# Altium footprint library ACTION标准库.pcblib: 504 footprints (part 27 of 32)
Each footprint in its own frame and in the unit in brackets; x right, y up, seen from the top. Pads: shape width x height; smd on the part's side, far side on the other; paste and mask are expansions set on the pad; w line width, h text height; cw(c..) or ccw(c..) is an arc to the next point about the centre after c.
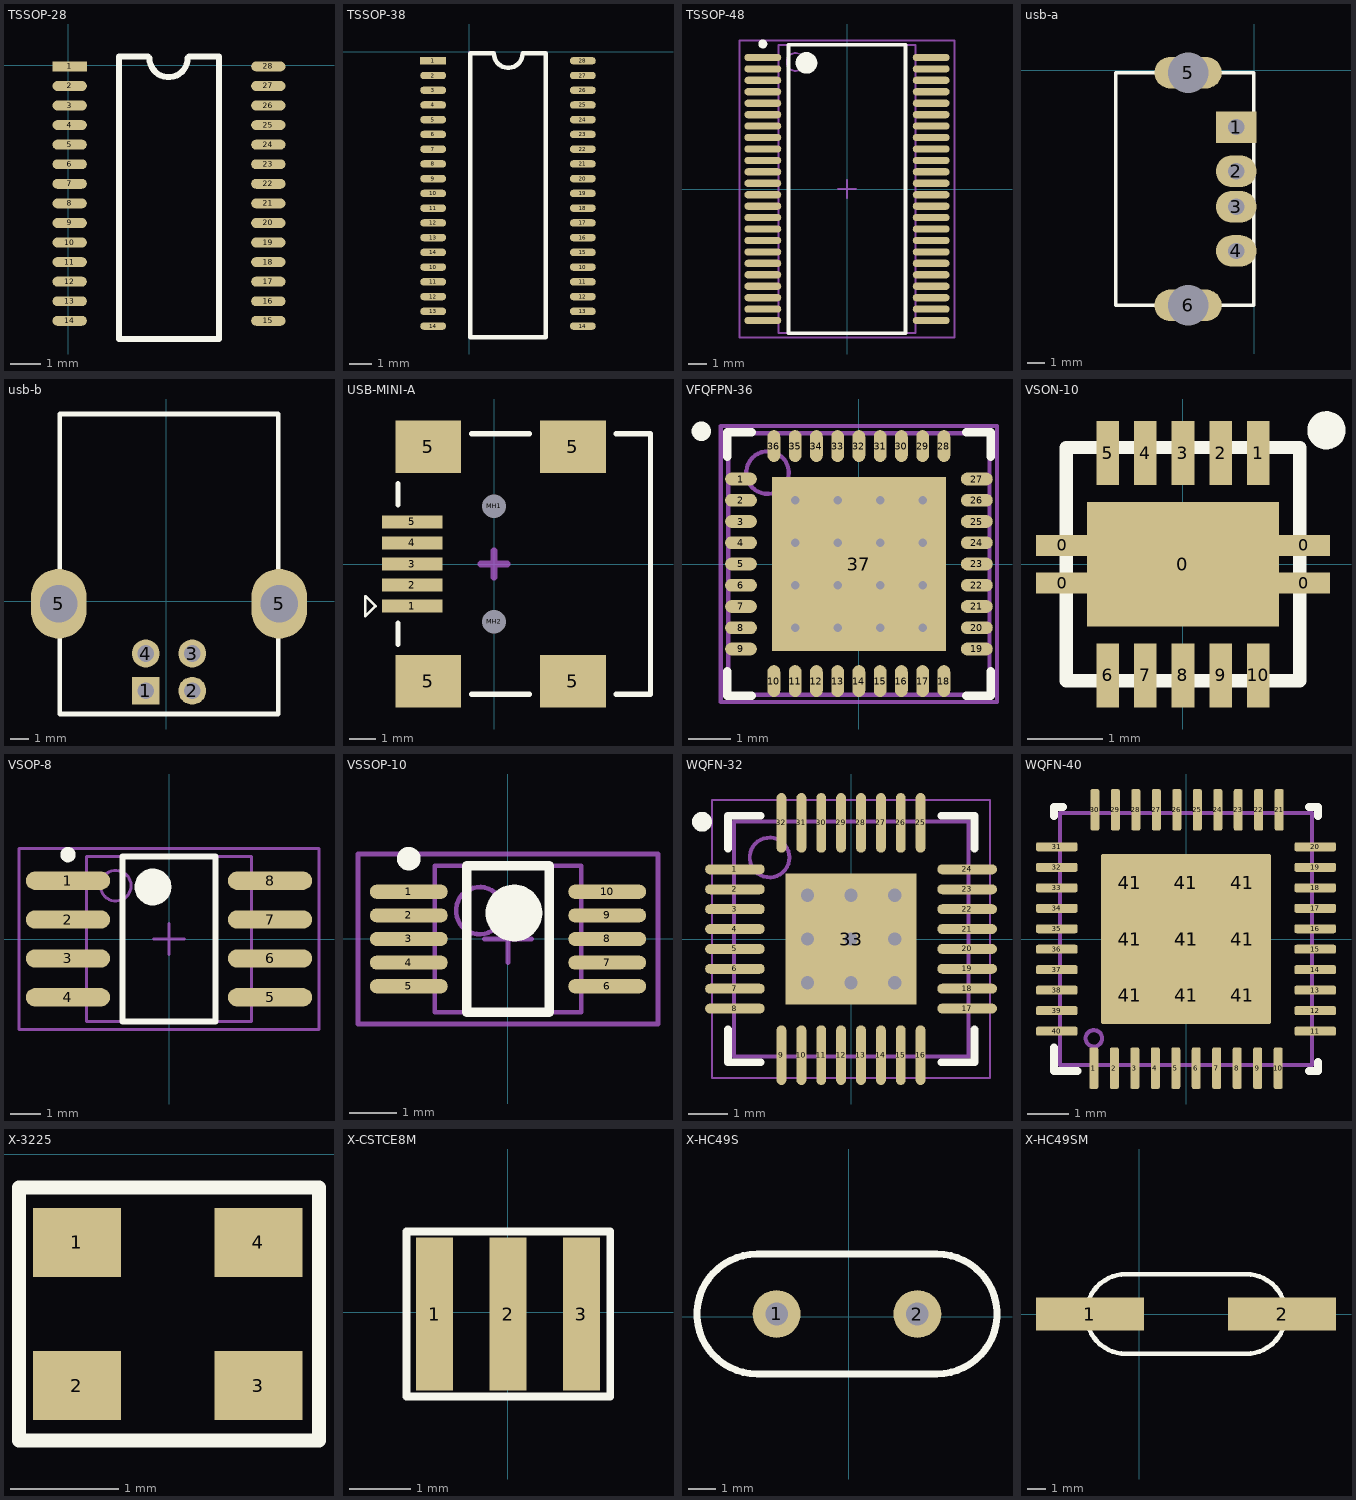
[diagram p26: the footprints below, top view; thin cyan lines are the x and y axes]

## TSSOP-28 [mm]
pads (28):
  rect 1.143x0.33 smd: 1(0.041,-0.046)
  oval 1.143x0.33 smd: 2(0.041,-0.696) 3(0.041,-1.346) 4(0.041,-1.996) 5(0.041,-2.646) 6(0.041,-3.296) 7(0.041,-3.946) 8(0.041,-4.596) 9(0.041,-5.246) 10(0.041,-5.896) 11(0.041,-6.546) 12(0.041,-7.196) 13(0.041,-7.846) 14(0.041,-8.496) 15(6.641,-8.496) 16(6.641,-7.846) 17(6.641,-7.196) 18(6.641,-6.546) 19(6.641,-5.896) 20(6.641,-5.246) 21(6.641,-4.596) 22(6.641,-3.946) 23(6.641,-3.296) 24(6.641,-2.646) 25(6.641,-1.996) 26(6.641,-1.346) 27(6.641,-0.696) 28(6.641,-0.046)
Top Overlay:
  lines w0.2: 2.642,0.279 1.676,0.279 1.676,-9.1 5.006,-9.1 5.006,0.279 4.013,0.279 ; 2.692,0.229 ccw(c3.327,0.229) 3.962,0.229
3D body "TSSOP-28.STEP": height 0.95, standoff -0.03, extent 0.178,-9.117 6.578,0.583

## TSSOP-38 [mm]
pads (38):
  rect 1.143x0.33 smd: 1(-1.584,-0.401)
  oval 1.143x0.33 smd: 2(-1.584,-1.051) 3(-1.584,-1.701) 4(-1.584,-2.351) 5(-1.584,-3.001) 6(-1.584,-3.651) 7(-1.584,-4.301) 8(-1.584,-4.951) 9(-1.584,-5.601) 10(-1.584,-9.501) 10(-1.584,-6.251) 10(5.016,-9.501) 11(-1.584,-10.151) 11(-1.584,-6.901) 11(5.016,-10.151) 12(-1.584,-10.801) 12(-1.584,-7.551) 12(5.016,-10.801) 13(-1.584,-11.451) 13(-1.584,-8.201) 13(5.016,-11.451) 14(-1.584,-12.101) 14(-1.584,-8.851) 14(5.016,-12.101) 15(5.016,-8.851) 16(5.016,-8.201) 17(5.016,-7.551) 18(5.016,-6.901) 19(5.016,-6.251) 20(5.016,-5.601) 21(5.016,-4.951) 22(5.016,-4.301) 23(5.016,-3.651) 24(5.016,-3.001) 25(5.016,-2.351) 26(5.016,-1.701) 27(5.016,-1.051) 28(5.016,-0.401)
Top Overlay:
  lines w0.2: 0.051,-12.6 3.381,-12.6 3.381,-0.076 2.362,-0.076 cw(c1.727,-0.076) 1.092,-0.076 0.051,-0.076 0.051,-12.6

## TSSOP-48 [mm]
height 2.79
pads (48):
  oval 2.05x0.4 smd: 1(-4.675,7.302) 2(-4.675,6.667) 3(-4.675,6.032) 4(-4.675,5.397) 5(-4.675,4.763) 6(-4.675,4.127) 7(-4.675,3.492) 8(-4.675,2.857) 9(-4.675,2.222) 10(-4.675,1.587) 11(-4.675,0.953) 12(-4.675,0.318) 13(-4.675,-0.318) 14(-4.675,-0.953) 15(-4.675,-1.587) 16(-4.675,-2.222) 17(-4.675,-2.857) 18(-4.675,-3.492) 19(-4.675,-4.127) 20(-4.675,-4.763) 21(-4.675,-5.397) 22(-4.675,-6.032) 23(-4.675,-6.667) 24(-4.675,-7.302) 25(4.675,-7.302) 26(4.675,-6.667) 27(4.675,-6.032) 28(4.675,-5.397) 29(4.675,-4.763) 30(4.675,-4.127) 31(4.675,-3.492) 32(4.675,-2.857) 33(4.675,-2.222) 34(4.675,-1.587) 35(4.675,-0.953) 36(4.675,-0.318) 37(4.675,0.318) 38(4.675,0.953) 39(4.675,1.587) 40(4.675,2.222) 41(4.675,2.857) 42(4.675,3.492) 43(4.675,4.127) 44(4.675,4.763) 45(4.675,5.397) 46(4.675,6.032) 47(4.675,6.667) 48(4.675,7.302)
Top Overlay:
  circle w0.25: c-4.675,8.053 r0.125
  circle w0.6: c-2.25,7 r0.3
  lines w0.2: -3.25,-8 -3.25,8 3.25,8 3.25,-8 -3.25,-8
Mechanical 13:
  circle w0.1: c-2.845,7.05 r0.5
  lines w0.1: -3.795,-8 -3.795,8 3.795,8 3.795,-8 -3.795,-8
Mechanical 15:
  lines w0.1: -0.5,0 0.5,0 ; 0,-0.5 0,0.5 ; -5.975,-8.25 -5.975,8.25 5.975,8.25 5.975,-8.25 -5.975,-8.25
3D body: height 2.79, standoff 0.1, extent -3.795,-8 3.795,8

## usb-a [mil]
pads (6):
  rect 90x70 hole 36: 1(-40,-126)
  oval 90x70 hole 36: 2(-40,-224.43) 3(-40,-303.17) 4(-40,-401.59)
  oval 149.61x70 hole 90.55: 5(-146.69,-5.13) 6(-146.69,-522.46)
Top Overlay:
  lines w8: -308,-522.46 -308,-5.13 -0.63,-5.13 -0.63,-522.46 -308,-522.46
3D body "USB-A DIP.STEP": height 273.62, standoff -165.35, extent -538.68,-575 0.68,47.05

## usb-b [mil]
pads (6):
  rect 60x60 hole 36: 1(-44,-192)
  round 60 hole 36: 2(56,-192) 3(56,-112) 4(-44,-112)
  oval 120x150 hole 80: 5(-231,-5) 5(243,-5)
Top Overlay:
  lines w10: -229,-242 241,-242 241,-2 241,273 241,403 -229,403 -229,-2 -229,-242
3D body "USB_B.STEP": height 393.7, standoff -182.79, extent -280.27,-247 302.27,402.61

## USB-MINI-A [mm] "MINI型USB，7.9*7.5*4.1mm"
pads (11):
  rect 2.3x0.5 smd: 1(-3.108,-1.6) 2(-3.108,-0.8) 3(-3.108,0) 4(-3.108,0.8) 5(-3.108,1.6)
  rect 2.5x2 smd: 5(-2.5,-4.45) 5(-2.5,4.45) 5(3,-4.45) 5(3,4.45)
  round 0.6 hole 0.9 unplated: MH1(0,2.2) MH2(0,-2.2)
Top Overlay:
  lines w0.1: -4.886,-1.981 -4.886,-1.219 -4.505,-1.6 -4.886,-1.981
  lines w0.2: -3.65,-3.05 -3.65,-2.25 ; -3.65,2.25 -3.65,3.05 ; -0.85,-4.95 1.35,-4.95 ; -0.85,4.95 1.35,4.95 ; 4.65,-4.95 5.95,-4.95 5.95,4.95 4.65,4.95
Mechanical 15:
  lines w0.254: -0.508,0 0.508,0 ; 0,-0.508 0,0.508
3D body "USB MINI B型 贴片-": height 3.95, standoff -0.7, extent -3.7,-4.75 6,4.75

## VFQFPN-36 [mm]
pads (37):
  oval 0.75x0.3 smd: 1(-2.775,2) 2(-2.775,1.5) 3(-2.775,1) 4(-2.775,0.5) 5(-2.775,0) 6(-2.775,-0.5) 7(-2.775,-1) 8(-2.775,-1.5) 9(-2.775,-2) 19(2.775,-2) 20(2.775,-1.5) 21(2.775,-1) 22(2.775,-0.5) 23(2.775,0) 24(2.775,0.5) 25(2.775,1) 26(2.775,1.5) 27(2.775,2)
  oval 0.3x0.75 smd: 10(-2,-2.755) 11(-1.5,-2.755) 12(-1,-2.755) 13(-0.5,-2.755) 14(0,-2.755) 15(0.5,-2.755) 16(1,-2.755) 17(1.5,-2.755) 18(2,-2.755) 28(2,2.775) 29(1.5,2.775) 30(1,2.775) 31(0.5,2.775) 32(0,2.775) 33(-0.5,2.775) 34(-1,2.775) 35(-1.5,2.775) 36(-2,2.775)
  rect 4.1x4.1 smd: 37(0,0)
via 1.5,-1.5 diameter 0.4 hole 0.2
via 0.5,-1.5 diameter 0.4 hole 0.2
via -0.5,-1.5 diameter 0.4 hole 0.2
via -1.5,-1.5 diameter 0.4 hole 0.2
via 1.5,-0.5 diameter 0.4 hole 0.2
via 0.5,-0.5 diameter 0.4 hole 0.2
via -0.5,-0.5 diameter 0.4 hole 0.2
via -1.5,-0.5 diameter 0.4 hole 0.2
via 1.5,0.5 diameter 0.4 hole 0.2
via 0.5,0.5 diameter 0.4 hole 0.2
via -0.5,0.5 diameter 0.4 hole 0.2
via -1.5,0.5 diameter 0.4 hole 0.2
via 1.5,1.5 diameter 0.4 hole 0.2
via 0.5,1.5 diameter 0.4 hole 0.2
via -0.5,1.5 diameter 0.4 hole 0.2
via -1.5,1.5 diameter 0.4 hole 0.2
Top Overlay:
  circle w0.25: c-3.708,3.124 r0.102
  lines w0.2: -3.1,-2.525 -3.1,-3.1 -2.525,-3.1 ; -3.1,2.525 -3.1,3.1 -2.525,3.1 ; 2.525,-3.1 3.1,-3.1 3.1,-2.525 ; 2.525,3.1 3.1,3.1 3.1,2.525
Mechanical 13:
  circle w0.1: c-2.15,2.15 r0.5
  lines w0.1: -3.075,3.05 -3.075,-3.075 3.075,-3.075 3.075,3.075 -3.075,3.075
Mechanical 15:
  lines w0.1: -0.5,0 0.5,0 ; 0,-0.5 0,0.5 ; -3.25,-3.25 3.25,-3.25 3.25,3.25 -3.25,3.25 -3.25,-3.25

## VSON-10 [mm]
pads (15):
  rect 0.7x0.28 smd mask+0.07: 0(-1.602,-0.25) 0(-1.602,0.25) 0(1.602,-0.25) 0(1.602,0.25)
  rect 2.55x1.65 smd: 0(0,0)
  rect 0.3x0.85 smd mask+0.07: 1(1,1.475) 2(0.5,1.475) 3(0,1.475) 4(-0.5,1.475) 5(-1,1.475) 6(-1,-1.475) 7(-0.5,-1.475) 8(0,-1.475) 9(0.5,-1.475) 10(1,-1.475)
Top Overlay:
  circle w0.254: c1.905,1.778 r0.127
  lines w0.178: -1.55,-1.55 1.55,-1.55 1.55,1.55 -1.55,1.55 -1.55,-1.55

## VSOP-8 [mm] "TSOP, 8-Leads, Body 5.4x5.4mm (max), Pitch 1.27mm, IPC Medium Density"
height 1
pads (8):
  oval 2.75x0.6 smd: 1(-3.3,1.905) 2(-3.3,0.635) 3(-3.3,-0.635) 4(-3.3,-1.905) 5(3.3,-1.905) 6(3.3,-0.635) 7(3.3,0.635) 8(3.3,1.905)
Top Overlay:
  circle w0.6: c-0.525,1.7 r0.3
  circle w0.25: c-3.3,2.755 r0.125
  lines w0.2: -1.525,-2.7 1.525,-2.7 1.525,2.7 -1.525,2.7 -1.525,-2.7
Mechanical 13:
  circle w0.1: c-1.74,1.74 r0.5
  lines w0.1: -2.69,-2.69 2.69,-2.69 2.69,2.69 -2.69,2.69 -2.69,-2.69
Mechanical 15:
  lines w0.1: -0.5,0 0.5,0 ; 0,-0.5 0,0.5 ; -4.9,-2.95 4.9,-2.95 4.9,2.95 -4.9,2.95 -4.9,-2.95
3D body "User Library-VSOP8.STEP": height 1, standoff 0, extent -3.999,-2.69 4.101,2.69

## VSSOP-10 [mm]
height 1.1
pads (10):
  oval 1.65x0.3 smd: 1(-2.1,1) 2(-2.1,0.5) 3(-2.1,0) 4(-2.1,-0.5) 5(-2.1,-1) 6(2.1,-1) 7(2.1,-0.5) 8(2.1,0) 9(2.1,0.5) 10(2.1,1)
Top Overlay:
  circle w0.6: c0.125,0.55 r0.3
  circle w0.25: c-2.1,1.7 r0.125
  lines w0.2: -0.875,-1.55 0.875,-1.55 0.875,1.55 -0.875,1.55 -0.875,-1.55
Mechanical 13:
  circle w0.1: c-0.6,0.6 r0.5
  lines w0.1: -1.55,-1.55 1.55,-1.55 1.55,1.55 -1.55,1.55 -1.55,-1.55
Mechanical 15:
  lines w0.1: -0.5,0 0.5,0 ; 0,-0.5 0,0.5 ; -3.175,-1.8 3.175,-1.8 3.175,1.8 -3.175,1.8 -3.175,-1.8
3D body: height 1.1, standoff 0.1, extent -1.55,-1.55 1.55,1.55

## WQFN-32 [mm] "QFN, 32-Leads, Body 5.85x5.85mm, Pitch 0.50mm, Thermal Pad 3.45x3.45mm, IPC Medium Density"
height 0.8
pads (33):
  oval 1.5x0.25 smd: 1(-2.921,1.753) 2(-2.921,1.25) 3(-2.921,0.75) 4(-2.921,0.25) 5(-2.921,-0.25) 6(-2.921,-0.75) 7(-2.921,-1.25) 8(-2.921,-1.75) 17(2.921,-1.75) 18(2.921,-1.25) 19(2.921,-0.75) 20(2.921,-0.25) 21(2.921,0.25) 22(2.921,0.75) 23(2.921,1.25) 24(2.921,1.753)
  oval 0.25x1.5 smd: 9(-1.753,-2.921) 10(-1.25,-2.921) 11(-0.75,-2.921) 12(-0.25,-2.921) 13(0.25,-2.921) 14(0.75,-2.921) 15(1.25,-2.921) 16(1.75,-2.921) 25(1.75,2.921) 26(1.25,2.921) 27(0.75,2.921) 28(0.25,2.921) 29(-0.25,2.921) 30(-0.75,2.921) 31(-1.25,2.921) 32(-1.753,2.921)
  rect 3.3x3.3 smd: 33(0,0)
via -1.1,1.1 diameter 0.508 hole 0.33
via 0,1.1 diameter 0.508 hole 0.33
via 1.1,1.1 diameter 0.508 hole 0.33
via -1.1,0 diameter 0.508 hole 0.33
via 0,0 diameter 0.508 hole 0.33
via 1.1,0 diameter 0.508 hole 0.33
via -1.1,-1.1 diameter 0.508 hole 0.33
via 0,-1.1 diameter 0.508 hole 0.33
via 1.1,-1.1 diameter 0.508 hole 0.33
Top Overlay:
  circle w0.25: c-3.75,2.95 r0.125
  lines w0.2: -3.1,-2.275 -3.1,-3.1 -2.275,-3.1 ; -3.1,2.275 -3.1,3.1 -2.275,3.1 ; 2.275,-3.1 3.1,-3.1 3.1,-2.275 ; 2.275,3.1 3.1,3.1 3.1,2.275
Mechanical 13:
  circle w0.1: c-2.05,2.05 r0.5
  lines w0.1: -2.95,-2.95 -2.95,2.95 2.95,2.95 2.95,-2.95 -2.95,-2.95
Mechanical 15:
  lines w0.05: -3.5,-3.5 -3.5,3.5 3.5,3.5 3.5,-3.5 -3.5,-3.5
  lines w0.1: -0.5,0 0.5,0 ; 0,-0.5 0,0.5
3D body: height 0.8, standoff 0.01, extent -2.95,-2.95 2.95,2.95

## WQFN-40 [mm] "QFN, 40-Leads, Body 6.80x6.80mm, Pitch 0.50mm, Thermal Pad 4.10x4.10mm, IPC Medium Density"
height 1
pads (50):
  rrect45% 0.22x1.016 smd mask+0.07: 1(-2.25,-3.154) 2(-1.75,-3.154) 3(-1.25,-3.154) 4(-0.75,-3.154) 5(-0.25,-3.154) 6(0.25,-3.154) 7(0.75,-3.154) 8(1.25,-3.154) 9(1.75,-3.154) 10(2.25,-3.154) 21(2.275,3.154) 22(1.775,3.154) 23(1.275,3.154) 24(0.775,3.154) 25(0.275,3.154) 26(-0.225,3.154) 27(-0.725,3.154) 28(-1.225,3.154) 29(-1.725,3.154) 30(-2.225,3.154)
  rrect45% 1.016x0.22 smd mask+0.07: 11(3.154,-2.25) 12(3.154,-1.75) 13(3.154,-1.25) 14(3.154,-0.75) 15(3.154,-0.25) 16(3.154,0.25) 17(3.154,0.75) 18(3.154,1.25) 19(3.154,1.75) 20(3.154,2.25) 31(-3.154,2.25) 32(-3.154,1.75) 33(-3.154,1.25) 34(-3.154,0.75) 35(-3.154,0.25) 36(-3.154,-0.25) 37(-3.154,-0.75) 38(-3.154,-1.25) 39(-3.154,-1.75) 40(-3.154,-2.25)
  rrect9% 1.17x1.17 on Top Paste: 41(-1.37,-1.37) 41(-1.37,0) 41(-1.37,1.37) 41(0,1.37) 41(0,-1.37) 41(0,0) 41(1.37,0) 41(1.37,-1.37) 41(1.37,1.37)
  rrect2% 4.15x4.15 smd paste-2.1: 41(0,0)
Top Overlay:
  lines w0.2: -3.225,-2.65 -3.225,-3.225 -2.65,-3.225 ; -3.225,3 -3.225,3.225 -3,3.225 ; 3,-3.225 3.225,-3.225 3.225,-3 ; 3,3.225 3.225,3.225 3.225,3
Mechanical 5:
  circle w0.1: c-2.25,-2.425 r0.2
  lines w0.1: -3.075,-3.075 3.075,-3.075 3.075,3.075 -3.075,3.075 -3.075,-3.075
3D body "RHA0040B.stp": height 1, standoff 0, extent -3,-3 3,3

## X-3225 [mil]
pads (4):
  rect 32x25 smd: 1(43,-32) 2(43,-84) 3(109,-84) 4(109,-32)
Top Overlay:
  lines w5: 22,-104 131,-104 131,-12 22,-12 22,-104
3D body "晶振 (1).STEP": height 50, standoff 1.97, extent 22.13,-101.9 129,-14.1

## X-CSTCE8M [mm]
pads (3):
  rect 0.6x2.5 smd: 1(-1.194,-0.025) 2(0.006,-0.025) 3(1.206,-0.025)
Top Overlay:
  lines w0.127: -1.651,-1.372 -1.651,1.321 1.676,1.321 1.676,-1.372 -1.651,-1.372
3D body: height 1, standoff 0, extent -1.6,-1.067 1.626,0.965

## X-HC49S [mil]
pads (2):
  round 68 hole 32: 1(-102.36,3.94) 2(97.64,3.94)
Top Overlay:
  lines w10: -130.36,-81.07 cw(c-130.36,3.94) -130.36,88.94 125.64,88.94 cw(c125.64,3.94) 125.64,-81.07 -130.36,-81.07
3D body "晶振.STEP": height 118.11, standoff -78.74, extent -235.22,-74.8 237.22,82.68

## X-HC49SM [mil]
height 200
pads (2):
  rect 230x70 smd: 1(-105,0) 2(305,0)
Top Overlay:
  lines w10: -28,-85.01 cw(c-28,0) -28,85.01 228,85.01 cw(c228,0) 228,-85.01 -28,-85.01
3D body "晶振 (2).STEP": height 169.29, standoff 0, extent -150.97,-101.08 352.97,89.08